# Altium footprint library JL_PCB.PCBLIB: 1112 footprints (part 14 of 71)
Each footprint in its own frame and in the unit in brackets; x right, y up, seen from the top. Pads: shape width x height; smd on the part's side, far side on the other; paste and mask are expansions set on the pad; w line width, h text height; cw(c..) or ccw(c..) is an arc to the next point about the centre after c.
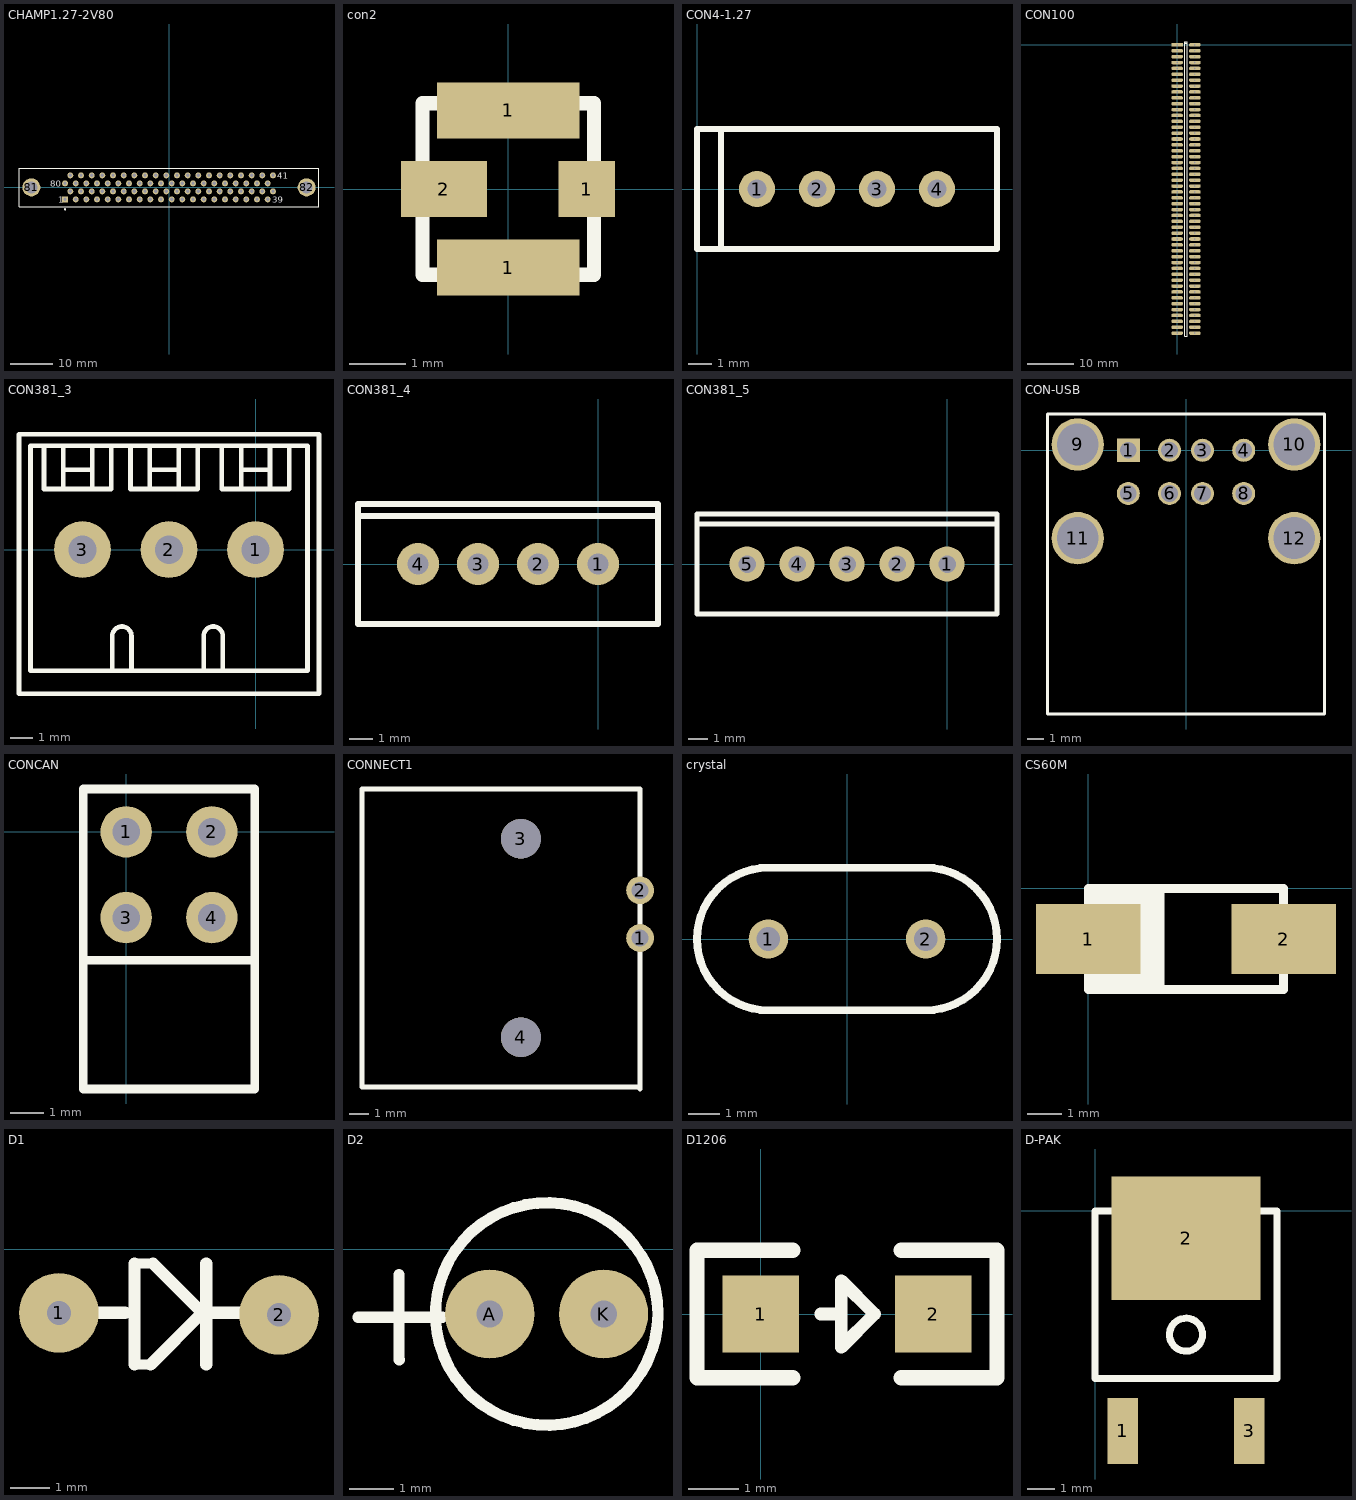
[diagram p13: the footprints below, top view; thin cyan lines are the x and y axes]

## CHAMP1.27-2V80 [mm] "Connector; 80 Position; Vertical; Pitch 1.27 mm"
height 11.1
pads (82):
  rect 1.4x1.4 hole 0.8: 1(-24.765,-2.857)
  round 1.4 hole 0.8: 2(-23.495,-0.953) 3(-22.225,-2.857) 4(-20.955,-0.953) 5(-19.685,-2.857) 6(-18.415,-0.953) 7(-17.145,-2.857) 8(-15.875,-0.953) 9(-14.605,-2.857) 10(-13.335,-0.953) 11(-12.065,-2.857) 12(-10.795,-0.953) 13(-9.525,-2.857) 14(-8.255,-0.953) 15(-6.985,-2.857) 16(-5.715,-0.953) 17(-4.445,-2.857) 18(-3.175,-0.953) 19(-1.905,-2.857) 20(-0.635,-0.953) 21(0.635,-2.857) 22(1.905,-0.953) 23(3.175,-2.857) 24(4.445,-0.953) 25(5.715,-2.857) 26(6.985,-0.953) 27(8.255,-2.857) 28(9.525,-0.953) 29(10.795,-2.857) 30(12.065,-0.953) 31(13.335,-2.857) 32(14.605,-0.953) 33(15.875,-2.857) 34(17.145,-0.953) 35(18.415,-2.857) 36(19.685,-0.953) 37(20.955,-2.857) 38(22.225,-0.953) 39(23.495,-2.857) 40(24.765,-0.953) 41(24.765,2.857) 42(23.495,0.953) 43(22.225,2.857) 44(20.955,0.953) 45(19.685,2.857) 46(18.415,0.953) 47(17.145,2.857) 48(15.875,0.953) 49(14.605,2.857) 50(13.335,0.953) 51(12.065,2.857) 52(10.795,0.953) 53(9.525,2.857) 54(8.255,0.953) 55(6.985,2.857) 56(5.715,0.953) 57(4.445,2.857) 58(3.175,0.953) 59(1.905,2.857) 60(0.635,0.953) 61(-0.635,2.857) 62(-1.905,0.953) 63(-3.175,2.857) 64(-4.445,0.953) 65(-5.715,2.857) 66(-6.985,0.953) 67(-8.255,2.857) 68(-9.525,0.953) 69(-10.795,2.857) 70(-12.065,0.953) 71(-13.335,2.857) 72(-14.605,0.953) 73(-15.875,2.857) 74(-17.145,0.953) 75(-18.415,2.857) 76(-19.685,0.953) 77(-20.955,2.857) 78(-22.225,0.953) 79(-23.495,2.857) 80(-24.765,0.953)
  round 4.3 hole 2.8: 81(-32.775,0) 82(32.775,0)
TopOverlay:
  circle w0.25: c-24.765,-5.25 r0.125
  lines w0.2: -35.725,-4.6 35.725,-4.6 35.725,4.6 -35.725,4.6 -35.725,-4.6
  text "41" at 25.84,2.107 h1.5
  text "80" at -28.34,0.202 h1.5
  text "39" at 24.57,-3.608 h1.5
  text "1" at -26.34,-3.608 h1.5

## con2 [mil]
pads (4):
  rect 100x39.37 smd: 1(0,-55) 1(0,55)
  rect 39.37x39.37 smd: 1(55,0)
  rect 60x39.37 smd: 2(-45,0)
TopOverlay:
  lines w10: -60,-60 -60,60 60,60 60,-60 -60,-60

## CON4-1.27 [mil]
pads (4):
  round 60 hole 32: 1(100,0) 2(200,0) 3(300,0) 4(400,0)
TopOverlay:
  lines w10: 40,-100 40,100 ; 0,-100 0,100 500,100 500,-100 0,-100

## CON100 [mil]
pads (100):
  rect 100x30 smd: 1(0,0)
  oval 100x30 smd: 2(0,-50) 3(0,-100) 4(0,-150) 5(0,-200) 6(0,-250) 7(0,-300) 8(0,-350) 9(0,-400) 10(0,-450) 11(0,-500) 12(0,-550) 13(0,-600) 14(0,-650) 15(0,-700) 16(0,-750) 17(0,-800) 18(0,-850) 19(0,-900) 20(0,-950) 21(0,-1000) 22(0,-1050) 23(0,-1100) 24(0,-1150) 25(0,-1200) 26(0,-1250) 27(0,-1300) 28(0,-1350) 29(0,-1400) 30(0,-1450) 31(0,-1500) 32(0,-1550) 33(0,-1600) 34(0,-1650) 35(0,-1700) 36(0,-1750) 37(0,-1800) 38(0,-1850) 39(0,-1900) 40(0,-1950) 41(0,-2000) 42(0,-2050) 43(0,-2100) 44(0,-2150) 45(0,-2200) 46(0,-2250) 47(0,-2300) 48(0,-2350) 49(0,-2400) 50(0,-2450) 51(150,-2450) 52(150,-2400) 53(150,-2350) 54(150,-2300) 55(150,-2250) 56(150,-2200) 57(150,-2150) 58(150,-2100) 59(150,-2050) 60(150,-2000) 61(150,-1950) 62(150,-1900) 63(150,-1850) 64(150,-1800) 65(150,-1750) 66(150,-1700) 67(150,-1650) 68(150,-1600) 69(150,-1550) 70(150,-1500) 71(150,-1450) 72(150,-1400) 73(150,-1350) 74(150,-1300) 75(150,-1250) 76(150,-1200) 77(150,-1150) 78(150,-1100) 79(150,-1050) 80(150,-1000) 81(150,-950) 82(150,-900) 83(150,-850) 84(150,-800) 85(150,-750) 86(150,-700) 87(150,-650) 88(150,-600) 89(150,-550) 90(150,-500) 91(150,-450) 92(150,-400) 93(150,-350) 94(150,-300) 95(150,-250) 96(150,-200) 97(150,-150) 98(150,-100) 99(150,-50) 100(150,0)
via 150,-100 diameter 30 hole 15
via 150,0 diameter 30 hole 15
via 150,-50 diameter 30 hole 15
via 150,-150 diameter 30 hole 15
via 150,-200 diameter 30 hole 15
via 150,-350 diameter 30 hole 15
via 150,-250 diameter 30 hole 15
via 150,-300 diameter 30 hole 15
via 150,-400 diameter 30 hole 15
via 150,-450 diameter 30 hole 15
via 150,-600 diameter 30 hole 15
via 150,-500 diameter 30 hole 15
via 150,-550 diameter 30 hole 15
via 150,-650 diameter 30 hole 15
via 150,-700 diameter 30 hole 15
via 150,-850 diameter 30 hole 15
via 150,-750 diameter 30 hole 15
via 150,-800 diameter 30 hole 15
via 150,-900 diameter 30 hole 15
via 150,-950 diameter 30 hole 15
via 150,-1100 diameter 30 hole 15
via 150,-1000 diameter 30 hole 15
via 150,-1050 diameter 30 hole 15
via 150,-1150 diameter 30 hole 15
via 150,-1200 diameter 30 hole 15
via 150,-1350 diameter 30 hole 15
via 150,-1250 diameter 30 hole 15
via 150,-1300 diameter 30 hole 15
via 150,-1400 diameter 30 hole 15
via 150,-1450 diameter 30 hole 15
via 150,-1600 diameter 30 hole 15
via 150,-1500 diameter 30 hole 15
via 150,-1550 diameter 30 hole 15
via 150,-1650 diameter 30 hole 15
via 150,-1700 diameter 30 hole 15
via 150,-1850 diameter 30 hole 15
via 150,-1750 diameter 30 hole 15
via 150,-1800 diameter 30 hole 15
via 150,-1900 diameter 30 hole 15
via 150,-1950 diameter 30 hole 15
via 150,-2100 diameter 30 hole 15
via 150,-2000 diameter 30 hole 15
via 150,-2050 diameter 30 hole 15
via 150,-2150 diameter 30 hole 15
via 150,-2200 diameter 30 hole 15
via 150,-2350 diameter 30 hole 15
via 150,-2250 diameter 30 hole 15
via 150,-2300 diameter 30 hole 15
via 150,-2400 diameter 30 hole 15
via 150,-2450 diameter 30 hole 15
via 0,-100 diameter 30 hole 15
via 0,0 diameter 30 hole 15
via 0,-50 diameter 30 hole 15
via 0,-150 diameter 30 hole 15
via 0,-200 diameter 30 hole 15
via 0,-350 diameter 30 hole 15
via 0,-250 diameter 30 hole 15
via 0,-300 diameter 30 hole 15
via 0,-400 diameter 30 hole 15
via 0,-450 diameter 30 hole 15
via 0,-600 diameter 30 hole 15
via 0,-500 diameter 30 hole 15
via 0,-550 diameter 30 hole 15
via 0,-650 diameter 30 hole 15
via 0,-700 diameter 30 hole 15
via 0,-850 diameter 30 hole 15
via 0,-750 diameter 30 hole 15
via 0,-800 diameter 30 hole 15
via 0,-900 diameter 30 hole 15
via 0,-950 diameter 30 hole 15
via 0,-1100 diameter 30 hole 15
via 0,-1000 diameter 30 hole 15
via 0,-1050 diameter 30 hole 15
via 0,-1150 diameter 30 hole 15
via 0,-1200 diameter 30 hole 15
via 0,-1350 diameter 30 hole 15
via 0,-1250 diameter 30 hole 15
via 0,-1300 diameter 30 hole 15
via 0,-1400 diameter 30 hole 15
via 0,-1450 diameter 30 hole 15
via 0,-1600 diameter 30 hole 15
via 0,-1500 diameter 30 hole 15
via 0,-1550 diameter 30 hole 15
via 0,-1650 diameter 30 hole 15
via 0,-1700 diameter 30 hole 15
via 0,-1850 diameter 30 hole 15
via 0,-1750 diameter 30 hole 15
via 0,-1800 diameter 30 hole 15
via 0,-1900 diameter 30 hole 15
via 0,-1950 diameter 30 hole 15
via 0,-2100 diameter 30 hole 15
via 0,-2000 diameter 30 hole 15
via 0,-2050 diameter 30 hole 15
via 0,-2150 diameter 30 hole 15
via 0,-2200 diameter 30 hole 15
via 0,-2350 diameter 30 hole 15
via 0,-2250 diameter 30 hole 15
via 0,-2300 diameter 30 hole 15
via 0,-2400 diameter 30 hole 15
via 0,-2450 diameter 30 hole 15
TopOverlay:
  lines w10: 62.5,25 ccw(c75,25) 87.5,25 65,25 65,-2475 85,-2475 85,25 62.5,25

## CON381_3 [mm]
pads (3):
  round 2.5 hole 1.25: 1(0,0) 2(-3.81,0) 3(-7.62,0)
TopOverlay:
  lines w0.203: -9.313,4.572 -9.313,2.667 -6.35,2.667 -6.35,4.572 ; -8.467,2.667 -8.467,4.572 ; -8.467,3.514 -7.197,3.514 ; -7.197,2.667 -7.197,4.572 ; -6.308,-5.292 -6.308,-3.81 cw(c-5.884,-3.81) -5.461,-3.81 -5.461,-5.292 ; -5.503,4.572 -5.503,2.667 -2.54,2.667 -2.54,4.572 ; -4.657,2.667 -4.657,4.572 ; -4.657,3.514 -3.387,3.514 ; -3.387,2.667 -3.387,4.572 ; -2.286,-5.292 -2.286,-3.81 cw(c-1.863,-3.81) -1.439,-3.81 -1.439,-5.292 ; -1.482,4.572 -1.482,2.667 1.482,2.667 1.482,4.572 ; -0.635,2.667 -0.635,4.572 ; -0.635,3.514 0.635,3.514 ; 0.635,2.667 0.635,4.572 ; -10.414,-6.35 -10.414,5.08 2.794,5.08 2.794,-6.35 -10.414,-6.35 ; -9.906,-5.334 -9.906,4.572 2.286,4.572 2.286,-5.334 -9.906,-5.334

## CON381_4 [mil]
pads (4):
  round 70 hole 35: 1(0,0) 2(-100,0) 3(-200,0) 4(-300,0)
TopOverlay:
  lines w10: -400,80 100,80 ; -400,-100 -400,100 100,100 100,-100 -400,-100

## CON381_5 [mil]
pads (5):
  round 70 hole 35: 1(0,0) 2(-100,0) 3(-200,0) 4(-300,0) 5(-400,0)
TopOverlay:
  lines w10: -500,80 100,80 ; -500,-100 -500,100 100,100 100,-100 -400,-100 -500,-100

## CON-USB [mil]
pads (12):
  rect 55x55 / inner round 55 / far side rect 55x55 hole 40: 1(-137.8,0)
  round 55 hole 40: 2(-39.37,0) 3(39.37,0) 4(137.8,0) 5(-137.8,-103.15) 6(-39.37,-103.15) 7(39.37,-103.15) 8(137.8,-103.15)
  round 125 hole 100: 9(-258.66,13.78) 10(258.66,13.78) 11(-258.66,-209.84) 12(258.66,-209.84)
TopOverlay:
  lines w8: -330.71,-629.92 -330.71,86.61 330.71,86.61 330.71,-629.92 -330.71,-629.92

## CONCAN [mil]
pads (4):
  round 60 hole 32: 1(0,0) 2(100,0) 3(0,-100) 4(100,-100)
TopOverlay:
  lines w10: -50,-150 150,-150 ; -50,-300 -50,50 150,50 150,-300 -50,-300

## CONNECT1 [mm]
pads (4):
  round 1.4 hole 0.85: 1(49.696,21.708) 2(49.696,24.108)
  round 2 hole 2: 3(43.696,26.708) 4(43.696,16.708)
TopOverlay:
  lines w0.254: 35.696,14.208 35.696,29.208 49.696,29.208 49.696,14.108 49.596,14.208 35.696,14.208

## crystal [mil]
pads (2):
  round 50 hole 30: 1(-100,0) 2(100,0)
TopOverlay:
  lines w10: -100,-90.55 cw(c-100,0) -100,90.55 100,90.55 cw(c100,0) 100,-90.55 -100,-90.55
3D body "CRYSTAL-HP49US.step": height 138.4, standoff -156.88, extent -224.43,-90 222.43,93.07

## CS60M [mm]
pads (2):
  rect 3x2 smd: 1(0,-1.45) 2(5.6,-1.45)
TopOverlay:
  rectangle: 0,-2.896 2.184,0
  lines w0.254: 0,-2.9 5.6,-2.9 5.6,0 0,0 0,-2.9

## D1 [mm]
pads (2):
  round 2 hole 0.6: 1(4.8,-1.6) 2(10.33,-1.65)
TopOverlay:
  lines w0.254: 6.7,-2.9 7.1,-2.9 ; 6.7,-0.36 7.16,-0.36
  lines w0.3: 6.7,-2.9 6.7,-0.36 ; 7.1,-2.9 8.4,-1.6 7.16,-0.36
  lines w0.305: 5.7,-1.6 6.462,-1.6 ; 8.5,-2.9 8.5,-0.36 ; 8.638,-1.6 9.4,-1.6

## D2 [mm]
pads (2):
  round 2 hole 0.6: A(7.02,-1.45) K(9.58,-1.45)
TopOverlay:
  circle w0.254: c8.3,-1.45 r2.5
  lines w0.254: 4.06,-1.52 5.95,-1.52 ; 4.98,-0.57 4.98,-2.47 4.99,-2.48

## D1206 [mil]
pads (2):
  rect 60x60 smd: 1(0,0) 2(135,0)
TopOverlay:
  lines w10: 47,0 63,0 ; 63,-26 63,26 89,0 63,-26
  lines w12: 25,-50 -50,-50 -50,50 25,50 ; 110,-50 185,-50 185,50 110,50

## D-PAK [mm]
height 2.3
pads (3):
  rect 1.1x2.4 smd: 1(1,-8) 3(5.6,-8)
  rect 5.4x4.5 smd: 2(3.3,-1)
TopOverlay:
  circle w0.254: c3.3,-4.5 r0.6
  lines w0.254: 0,-6.1 6.6,-6.1 6.6,0 0,0 0,-6.1
3D body "D-PAK.STEP": height 2.31, standoff 0, extent 0.028,-8.385 6.628,0.865